# Altium footprint library PCB_CONNECTORS.PcbLib: 676 footprints (part 42 of 43)
Each footprint in its own frame and in the unit in brackets; x right, y up, seen from the top. Pads: shape width x height; smd on the part's side, far side on the other; paste and mask are expansions set on the pad; w line width, h text height; cw(c..) or ccw(c..) is an arc to the next point about the centre after c.
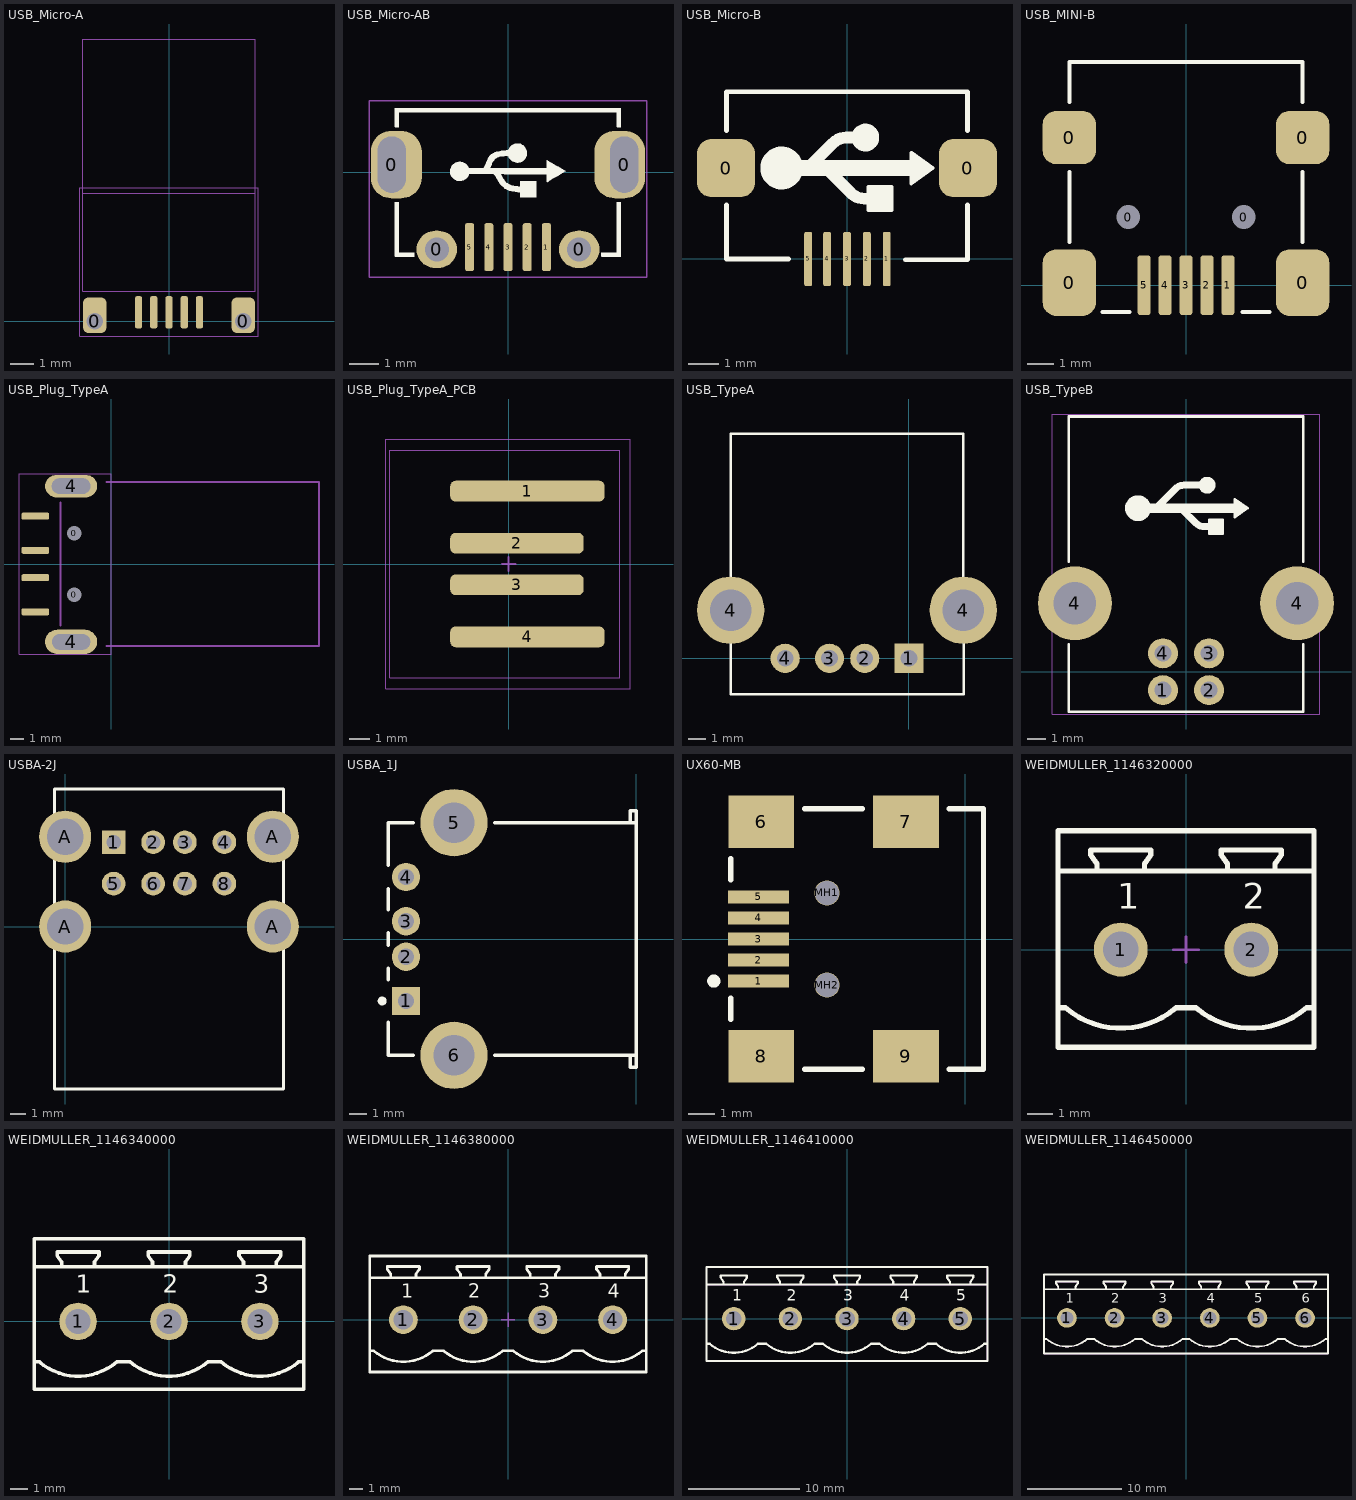
[diagram p41: the footprints below, top view; thin cyan lines are the x and y axes]

## USB_Micro-A [mil]
height 153.54
pads (7):
  rrect50% 40x60 hole 28 copper offset 0,10: 0(-125,0) 0(125,0)
  rrect50% 12x54 smd: 1(-51.18,15) 2(-25.59,15) 3(0,15) 4(25.59,15) 5(51.18,15)
Mechanical 13:
  lines w2: -145,215 145,215 ; -145,50 -145,475 145,475 145,50 -145,50
Mechanical 14:
  lines w2: -150,-25 -150,225 150,225 150,-25 -150,-25
  text ".Designator" at -90,80 h100
3D body "UJ2-MIBH-4-SMT.stp": height 108.27, standoff -24.02, extent -147.64,-15 147.64,449.57

## USB_Micro-AB [mil]
height 153.54
pads (9):
  rrect80% 68x90 hole 37 slot 75 at 90 deg copper offset 6,0 mask+0: 0(-155,10)
  oval 54x50 hole 32 mask+0: 0(-95,-103) 0(95,-103)
  rrect80% 68x90 hole 37 slot 75 at 90 deg copper offset -6,0 mask+0: 0(155,10)
  rrect50% 12x64 smd: 1(51.18,-100) 2(25.59,-100) 3(0,-100) 4(-25.59,-100) 5(-51.18,-100)
Top Overlay:
  drawing of 24 lines, arcs and shapes, not listed
Mechanical 14:
  lines w2: -185,-140 -185,95 185,95 185,-140 -185,-140
  text ".Designator" at -90,-45 h100
3D body "User Library-MicroUSB-B_Molex_105017-0001.STEP": height 108.07, standoff -21.85, extent -161.42,-109.33 161.42,104.45

## USB_Micro-B [mil]
height 153.54
pads (7):
  rrect50% 74.8x74.8 smd: 0(-155.51,116.84) 0(155.51,116.84)
  rrect50% 10x70 smd: 1(51.18,0) 2(25.59,0) 3(0,0) 4(-25.59,0) 5(-50,0)
Top Overlay:
  circle w20: c23.56,156.21 r7.87
  circle w35: c-84.07,117 r10
  region: 57.03,62.87 27.5,62.87 27.5,92.39 57.03,92.39
  region: 110.18,117 82.62,97.31 82.62,136.69
  lines w5: 27.5,62.87 57.03,62.87 57.03,92.39 27.5,92.39 27.5,62.87 ; 82.62,97.31 82.62,136.69 110.18,117 82.62,97.31
  lines w6: -155,69.8 -155,0 -75,0 ; -155,164.84 -155,215 155,215 155,164.84 ; 75,-1 155,-1 155,69.8
  lines w15: -52.85,114.46 -18.48,148.83 cw(c-0.65,131) -0.65,156.21 22.5,156.21 ; -24.7,114.54 4.83,85.01 ccw(c22.66,102.84) 22.66,77.63 42.5,77.63
  lines w20: -82.5,117 92.5,117
3D body "Micro USB.STP": height 106.7, standoff -9.04, extent -156.58,4.51 157.59,218.29

## USB_MINI-B [mil]
height 153.54
pads (11):
  rrect50% 80x100 smd: 0(-175.2,3.94) 0(175.19,3.94)
  rrect50% 80x80 smd: 0(-175.2,221.69) 0(175.19,221.69)
  round 23.62 hole 35.43 unplated: 0(-86.61,102.36) 0(86.61,102.36)
  rrect50% 20x90 smd: 1(62.99,0) 2(31.5,0) 3(0,0) 4(-31.5,0) 5(-62.99,0)
Top Overlay:
  lines w6: -175,65 -175,170 ; -175,275 -175,335 175,335 175,275 ; -125,-40 -85,-40 ; 85,-40 125,-40 ; 175,65 175,170
3D body "User Library-USB_mini_B.STEP": height 155.51, standoff -39.37, extent -210.63,-27.56 210.63,334.64

## USB_Plug_TypeA [mil]
height 177.17
pads (8):
  round 32 hole 42: 0(-106.3,-88.58) 0(-106.3,88.58)
  rrect50% 80x20 smd: 1(-218,137.8) 2(-218,39.37) 3(-218,-39.37) 4(-218,-137.8)
  oval 150x70 hole 45 slot 110 at 0 deg: 4(-115,-224)
  oval 150x65 hole 45 slot 111 at 0 deg: 4(-115,224)
Mechanical 13:
  lines w6: -145.67,-176.18 -145.67,176.18 ; -12.99,-236.22 598.43,-236.22 598.43,236.22 -12.99,236.22
Mechanical 14:
  lines w2: -265,-260 0,-260 0,260 -265,260 -265,-260
  text ".Designator" at -220,-25 h100
3D body "SW3dPS-USB-Male Port.STEP": height 70, standoff -117.5, extent -145.67,-236.37 576.08,236.37

## USB_Plug_TypeA_PCB [mm]
height 3.9
pads (4):
  rrect50% 7.41x1 smd: 1(0.897,3.5) 4(0.897,-3.5)
  rrect50% 6.41x1 smd: 2(0.397,1) 3(0.397,-1)
Mechanical 13:
  lines w0.051: -5.908,-6 -5.908,6 5.842,6 5.842,-6 -5.908,-6 ; -5.715,-5.461 5.334,-5.461 5.334,5.461 -5.715,5.461 -5.715,-5.461
  lines w0.1: -0.33,0 0.33,0 ; 0,-0.33 0,0.33

## USB_TypeA [mil]
pads (6):
  rect 65x65 hole 37: 1(0,0)
  round 65 hole 37: 2(-98.5,0) 3(-177,0) 4(-275.6,0)
  round 150 hole 93: 4(-397,107) 4(121,107)
Top Overlay:
  lines w6: 121,107 121,500 -397,500 -397,107 -397,-80 122,-80 122,107
3D body "User Library-USB-A-01.step": height 274.23, standoff -164.75, extent -449.02,-45 173.03,494.37

## USB_TypeB [mm]
height 11.1
pads (6):
  round 1.626 hole 0.914 mask+0.025: 1(-1.25,-0.995) 2(1.25,-0.995) 3(1.25,1.005) 4(-1.25,1.005)
  round 4 hole 2.3 mask+0: 4(-6.02,3.715) 4(6.02,3.715)
Top Overlay:
  circle w0.508: c1.145,10.115 r0.2
  circle w0.889: c-2.605,8.865 r0.254
  region: 1.995,7.49 1.245,7.49 1.245,8.24 1.995,8.24
  region: 3.345,8.865 2.645,8.365 2.645,9.365
  lines w0.127: 1.245,7.49 1.995,7.49 1.995,8.24 1.245,8.24 1.245,7.49 ; 2.645,8.365 2.645,9.365 3.345,8.865 2.645,8.365
  lines w0.152: -6.35,1.495 -6.35,-2.159 6.35,-2.159 6.35,1.495 ; -6.35,5.969 -6.35,13.843 6.35,13.843 6.35,5.969
  lines w0.381: -1.558,8.927 -0.558,9.927 cw(c-0.105,9.474) -0.105,10.115 1.145,10.115 ; -0.208,8.802 0.542,8.052 ccw(c0.995,8.505) 0.995,7.865 1.245,7.865
  lines w0.508: -2.105,8.865 2.645,8.865
Mechanical 14:
  lines w0.051: -7.239,-2.286 -7.239,13.97 7.239,13.97 7.239,-2.286 -7.239,-2.286
3D body "c-0292304-01-b-3d.stp": height 11.5, standoff -3.93, extent -7.194,-1.705 7.194,13.995

## USBA-2J [mm] "Dual port USB connector"
pads (12):
  rect 1.5x1.5 hole 0.92: 1(3.07,5.33)
  round 1.5 hole 0.92: 2(5.57,5.33) 3(7.57,5.33) 4(10.07,5.33) 5(3.07,2.71) 6(5.57,2.71) 7(7.57,2.71) 8(10.07,2.71)
  round 3.3 hole 2.3: A(0,0) A(0,5.68) A(13.14,0) A(13.14,5.68)
Top Overlay:
  lines w0.2: -0.68,-10.28 -0.68,8.7 13.82,8.7 13.82,-10.28 -0.68,-10.28
3D body "USBA-2J.STEP": height 16.15, standoff -3.99, extent -1.6,-10.29 14.659,6.89

## USBA_1J [mm] "Connector; USB1.1, Reverse Type, Thru-Hole; 4 Position; Right Angle"
height 6.95
pads (6):
  rect 1.6x1.6 hole 0.92: 1(-12.99,-3.5)
  round 1.6 hole 0.92: 2(-12.99,-1) 3(-12.99,1) 4(-12.99,3.5)
  round 3.8 hole 2.3: 5(-10.28,6.57) 6(-10.28,-6.57)
Top Overlay:
  circle w0.25: c-14.34,-3.5 r0.125
  lines w0.2: -14,-4.7 -14,-6.565 -12.58,-6.565 ; -14,-2.3 -14,-1.66 ; -14,-0.34 -14,0.34 ; -14,1.66 -14,2.84 ; -14,4.16 -14,6.565 -12.58,6.565 ; -7.98,-6.565 0,-6.565 ; -7.98,6.565 0,6.565 ; -0.32,-6.565 -0.32,-7.25 0,-7.25 0,-6.565 ; -0.32,6.565 -0.32,7.25 0,7.25 0,6.565 ; 0,-6.565 0,6.565
3D body "USB-1A.STEP": height 7.66, standoff -3.62, extent -14,-8.117 0,8.117

## UX60-MB [mm] "Connector; USB2.0, Type B, SM; 5 Position; Right Angle"
height 3.9
pads (11):
  rect 2.3x0.5 smd: 1(-7.85,-1.6) 2(-7.85,-0.8) 3(-7.85,0) 4(-7.85,0.8) 5(-7.85,1.6)
  rect 2.5x2 smd: 6(-7.75,4.45) 7(-2.25,4.45) 8(-7.75,-4.45) 9(-2.25,-4.45)
  round 0.95 hole 0.9 unplated: MH1(-5.25,1.75) MH2(-5.25,-1.75)
Top Overlay:
  circle w0.25: c-9.55,-1.6 r0.125
  lines w0.2: -8.9,-3.05 -8.9,-2.25 ; -8.9,2.25 -8.9,3.05 ; -6.1,-4.95 -3.9,-4.95 ; -6.1,4.95 -3.9,4.95 ; -0.6,-4.95 0.7,-4.95 0.7,4.95 -0.6,4.95
3D body "mini-usb2.stp": height 3.93, standoff -0.05, extent -8.825,-5.1 0.425,4.8

## WEIDMULLER_1146320000 [mm] "24A 400 V, Pitch 5.08mm, 2 Positions PCB Male Header, Type SL 5.08HC Serie"
height 12
pads (2):
  round 2.1 hole 1.4: 1(-2.54,0) 2(2.54,0)
Top Overlay:
  lines w0.2: -4.98,-2.26 -4.694,-2.26 ccw(c-2.54,0.24) -0.386,-2.26 0.386,-2.26 ccw(c2.54,0.24) 4.694,-2.26 4.98,-2.26 ; -4.98,3.06 4.98,3.06 ; -3.46,3.06 -3.46,3.323 -3.71,3.68 -3.71,3.88 -1.37,3.88 -1.37,3.68 -1.62,3.323 -1.62,3.06 ; 1.62,3.06 1.62,3.323 1.37,3.68 1.37,3.88 3.71,3.88 3.71,3.68 3.46,3.323 3.46,3.06 ; -4.98,-3.8 -4.98,4.63 4.98,4.63 4.98,-3.8 -4.98,-3.8
  text "1" at -2.675,1.6 h1
  text "2" at 2.2,1.6 h1
Mechanical 8:
  lines w0.1: -3.04,0 -2.54,0 ; -2.54,-0.5 -2.54,0 ; -2.54,0.5 -2.54,0 ; -2.04,0 -2.54,0 ; -0.5,0 0,0 ; 0,-0.5 0,0 ; 0,0.5 0,0 ; 0.5,0 0,0 ; 2.04,0 2.54,0 ; 2.54,-0.5 2.54,0 ; 2.54,0.5 2.54,0 ; 3.04,0 2.54,0
Mechanical 14:
  lines w0.1: -4.98,-2.26 -4.694,-2.26 ccw(c-2.54,0.24) -0.386,-2.26 0.386,-2.26 ccw(c2.54,0.24) 4.694,-2.26 4.98,-2.26 ; -4.98,3.06 4.98,3.06 ; -3.46,3.06 -3.46,3.323 -3.71,3.68 -3.71,3.88 -1.37,3.88 -1.37,3.68 -1.62,3.323 -1.62,3.06 ; 1.62,3.06 1.62,3.323 1.37,3.68 1.37,3.88 3.71,3.88 3.71,3.68 3.46,3.323 3.46,3.06 ; -4.98,-3.8 -4.98,4.63 4.98,4.63 4.98,-3.8 -4.98,-3.8 ; -3.04,-0.332 -3.04,0.332 -2.872,0.5 -2.208,0.5 -2.04,0.332 -2.04,-0.332 -2.2,-0.494 -2.872,-0.5 -3.04,-0.332 ; 2.04,-0.332 2.04,0.332 2.208,0.5 2.872,0.5 3.04,0.332 3.04,-0.332 2.88,-0.494 2.208,-0.5 2.04,-0.332
  text "2" at 2.2,1.6 h1
  text "1" at -2.675,1.6 h1
3D body "WEIDMULLER_1146320000.stp": height 12, standoff -3.2, extent -4.98,-3.8 4.98,4.63

## WEIDMULLER_1146340000 [mm] "24A 400 V, Pitch 5.08mm, 3 Positions PCB Male Header, Type SL 5.08HC Serie"
height 12
pads (3):
  round 2.1 hole 1.4: 1(-5.08,0) 2(0,0) 3(5.08,0)
Top Overlay:
  lines w0.2: -7.52,-2.26 -7.234,-2.26 ccw(c-5.08,0.24) -2.926,-2.26 -2.154,-2.26 ccw(c0,0.24) 2.154,-2.26 2.926,-2.26 ccw(c5.08,0.24) 7.234,-2.26 7.52,-2.26 ; -7.52,3.06 7.52,3.06 ; -6,3.06 -6,3.323 -6.25,3.68 -6.25,3.88 -3.91,3.88 -3.91,3.68 -4.16,3.323 -4.16,3.06 ; -0.92,3.06 -0.92,3.323 -1.17,3.68 -1.17,3.88 1.17,3.88 1.17,3.68 0.92,3.323 0.92,3.06 ; 4.16,3.06 4.16,3.323 3.91,3.68 3.91,3.88 6.25,3.88 6.25,3.68 6,3.323 6,3.06 ; -7.52,-3.8 -7.52,4.63 7.52,4.63 7.52,-3.8 -7.52,-3.8
  text "3" at 4.74,1.6 h1
  text "1" at -5.215,1.6 h1
  text "2" at -0.34,1.6 h1
Mechanical 8:
  lines w0.1: -5.58,0 -5.08,0 ; -5.08,-0.5 -5.08,0 ; -5.08,0.5 -5.08,0 ; -4.58,0 -5.08,0 ; 4.58,0 5.08,0 ; 5.08,-0.5 5.08,0 ; 5.08,0.5 5.08,0 ; 5.58,0 5.08,0 ; 0,0 0,0.5 0,0 ; 0,0 0.5,0 0,0 ; 0,0 0,-0.5 0,0 ; 0,0 -0.5,0 0,0
Mechanical 14:
  lines w0.1: -7.52,-2.26 -7.234,-2.26 ccw(c-5.08,0.24) -2.926,-2.26 -2.154,-2.26 ccw(c0,0.24) 2.154,-2.26 2.926,-2.26 ccw(c5.08,0.24) 7.234,-2.26 7.52,-2.26 ; -7.52,3.06 7.52,3.06 ; -6,3.06 -6,3.323 -6.25,3.68 -6.25,3.88 -3.91,3.88 -3.91,3.68 -4.16,3.323 -4.16,3.06 ; -0.92,3.06 -0.92,3.323 -1.17,3.68 -1.17,3.88 1.17,3.88 1.17,3.68 0.92,3.323 0.92,3.06 ; 4.16,3.06 4.16,3.323 3.91,3.68 3.91,3.88 6.25,3.88 6.25,3.68 6,3.323 6,3.06 ; -7.52,-3.8 -7.52,4.63 7.52,4.63 7.52,-3.8 -7.52,-3.8 ; -5.58,-0.332 -5.58,0.332 -5.412,0.5 -4.748,0.5 -4.58,0.332 -4.58,-0.332 -4.74,-0.494 -5.412,-0.5 -5.58,-0.332 ; -0.5,-0.332 -0.5,0.332 -0.332,0.5 0.332,0.5 0.5,0.332 0.5,-0.332 0.34,-0.494 -0.332,-0.5 -0.5,-0.332 ; 4.58,-0.332 4.58,0.332 4.748,0.5 5.412,0.5 5.58,0.332 5.58,-0.332 5.42,-0.494 4.748,-0.5 4.58,-0.332
  text "3" at 4.74,1.6 h1
  text "2" at -0.34,1.6 h1
  text "1" at -5.215,1.6 h1
3D body "WEIDMULLER_1146340000.stp": height 12, standoff -3.2, extent -7.52,-3.8 7.52,4.63

## WEIDMULLER_1146380000 [mm] "24A 400 V, Pitch 5.08mm, 4 Positions PCB Male Header, Type SL 5.08HC Serie"
height 12
pads (4):
  round 2.1 hole 1.4: 1(-7.62,0) 2(-2.54,0) 3(2.54,0) 4(7.62,0)
Top Overlay:
  lines w0.2: -10.06,-2.26 -9.774,-2.26 ccw(c-7.62,0.24) -5.466,-2.26 -4.694,-2.26 ccw(c-2.54,0.24) -0.386,-2.26 0.386,-2.26 ccw(c2.54,0.24) 4.694,-2.26 5.466,-2.26 ccw(c7.62,0.24) 9.774,-2.26 10.06,-2.26 ; -10.06,3.06 10.06,3.06 ; -8.54,3.06 -8.54,3.323 -8.79,3.68 -8.79,3.88 -6.45,3.88 -6.45,3.68 -6.7,3.323 -6.7,3.06 ; -3.46,3.06 -3.46,3.323 -3.71,3.68 -3.71,3.88 -1.37,3.88 -1.37,3.68 -1.62,3.323 -1.62,3.06 ; 1.62,3.06 1.62,3.323 1.37,3.68 1.37,3.88 3.71,3.88 3.71,3.68 3.46,3.323 3.46,3.06 ; 6.7,3.06 6.7,3.323 6.45,3.68 6.45,3.88 8.79,3.88 8.79,3.68 8.54,3.323 8.54,3.06 ; -10.06,-3.8 -10.06,4.63 10.06,4.63 10.06,-3.8 -10.06,-3.8
  text "4" at 7.28,1.6 h1
  text "3" at 2.2,1.6 h1
  text "1" at -7.755,1.6 h1
  text "2" at -2.88,1.6 h1
Mechanical 8:
  lines w0.1: -8.12,0 -7.62,0 ; -7.62,-0.5 -7.62,0 ; -7.62,0.5 -7.62,0 ; -7.12,0 -7.62,0 ; 7.12,0 7.62,0 ; 7.62,-0.5 7.62,0 ; 7.62,0.5 7.62,0 ; 8.12,0 7.62,0 ; -2.54,0 -2.54,0.5 -2.54,0 ; -2.54,0 -2.04,0 -2.54,0 ; -2.54,0 -2.54,-0.5 -2.54,0 ; -2.54,0 -3.04,0 -2.54,0 ; 0,0 0,0.5 0,0 ; 0,0 0.5,0 0,0 ; 0,0 0,-0.5 0,0 ; 0,0 -0.5,0 0,0 ; 2.54,0 2.54,0.5 2.54,0 ; 2.54,0 3.04,0 2.54,0 ; 2.54,0 2.54,-0.5 2.54,0 ; 2.54,0 2.04,0 2.54,0
Mechanical 14:
  lines w0.1: -10.06,-2.26 -9.774,-2.26 ccw(c-7.62,0.24) -5.466,-2.26 -4.694,-2.26 ccw(c-2.54,0.24) -0.386,-2.26 0.386,-2.26 ccw(c2.54,0.24) 4.694,-2.26 5.466,-2.26 ccw(c7.62,0.24) 9.774,-2.26 10.06,-2.26 ; -10.06,3.06 10.06,3.06 ; -8.54,3.06 -8.54,3.323 -8.79,3.68 -8.79,3.88 -6.45,3.88 -6.45,3.68 -6.7,3.323 -6.7,3.06 ; -3.46,3.06 -3.46,3.323 -3.71,3.68 -3.71,3.88 -1.37,3.88 -1.37,3.68 -1.62,3.323 -1.62,3.06 ; 1.62,3.06 1.62,3.323 1.37,3.68 1.37,3.88 3.71,3.88 3.71,3.68 3.46,3.323 3.46,3.06 ; 6.7,3.06 6.7,3.323 6.45,3.68 6.45,3.88 8.79,3.88 8.79,3.68 8.54,3.323 8.54,3.06 ; -10.06,-3.8 -10.06,4.63 10.06,4.63 10.06,-3.8 -10.06,-3.8 ; -8.12,-0.332 -8.12,0.332 -7.952,0.5 -7.288,0.5 -7.12,0.332 -7.12,-0.332 -7.28,-0.494 -7.952,-0.5 -8.12,-0.332 ; -3.04,-0.332 -3.04,0.332 -2.872,0.5 -2.208,0.5 -2.04,0.332 -2.04,-0.332 -2.2,-0.494 -2.872,-0.5 -3.04,-0.332 ; 2.04,-0.332 2.04,0.332 2.208,0.5 2.872,0.5 3.04,0.332 3.04,-0.332 2.88,-0.494 2.208,-0.5 2.04,-0.332 ; 7.12,-0.332 7.12,0.332 7.288,0.5 7.952,0.5 8.12,0.332 8.12,-0.332 7.96,-0.494 7.288,-0.5 7.12,-0.332
  text "4" at 7.28,1.6 h1
  text "3" at 2.2,1.6 h1
  text "2" at -2.88,1.6 h1
  text "1" at -7.755,1.6 h1
3D body "WEIDMULLER_1146380000.stp": height 12, standoff -3.2, extent -10.06,-3.8 10.06,4.63

## WEIDMULLER_1146410000 [mm] "24A 400 V, Pitch 5.08mm, 5 Positions PCB Male Header, Type SL 5.08HC Serie"
height 12
pads (5):
  round 2.1 hole 1.4: 1(-10.16,0) 2(-5.08,0) 3(0,0) 4(5.08,0) 5(10.16,0)
Top Overlay:
  lines w0.2: -12.6,-2.26 -12.314,-2.26 ccw(c-10.16,0.24) -8.006,-2.26 -7.234,-2.26 ccw(c-5.08,0.24) -2.926,-2.26 -2.154,-2.26 ccw(c0,0.24) 2.154,-2.26 2.926,-2.26 ccw(c5.08,0.24) 7.234,-2.26 8.006,-2.26 ccw(c10.16,0.24) 12.314,-2.26 12.6,-2.26 ; -12.6,3.06 12.6,3.06 ; -11.08,3.06 -11.08,3.323 -11.33,3.68 -11.33,3.88 -8.99,3.88 -8.99,3.68 -9.24,3.323 -9.24,3.06 ; -6,3.06 -6,3.323 -6.25,3.68 -6.25,3.88 -3.91,3.88 -3.91,3.68 -4.16,3.323 -4.16,3.06 ; -0.92,3.06 -0.92,3.323 -1.17,3.68 -1.17,3.88 1.17,3.88 1.17,3.68 0.92,3.323 0.92,3.06 ; 4.16,3.06 4.16,3.323 3.91,3.68 3.91,3.88 6.25,3.88 6.25,3.68 6,3.323 6,3.06 ; 9.24,3.06 9.24,3.323 8.99,3.68 8.99,3.88 11.33,3.88 11.33,3.68 11.08,3.323 11.08,3.06 ; -12.6,-3.8 12.6,-3.8 12.6,4.63 -12.6,4.63 -12.6,-3.8
  text "3" at -0.34,1.6 h1
  text "1" at -10.295,1.6 h1
  text "2" at -5.42,1.6 h1
  text "4" at 4.74,1.6 h1
  text "5" at 9.82,1.6 h1
Mechanical 8:
  lines w0.1: -10.66,0 -10.16,0 ; -10.16,-0.5 -10.16,0 ; -10.16,0.5 -10.16,0 ; -9.66,0 -10.16,0 ; 9.66,0 10.16,0 ; 10.16,-0.5 10.16,0 ; 10.16,0.5 10.16,0 ; 10.66,0 10.16,0 ; -5.08,0 -5.58,0 -5.08,0 ; -5.08,0 -5.08,-0.5 -5.08,0 ; -5.08,0 -4.58,0 -5.08,0 ; -5.08,0 -5.08,0.5 -5.08,0 ; -0.5,0 0,0 ; -0.5,0 0,0 ; -0.5,0 0,0 ; -0.5,0 0,0 ; 0,-0.5 0,0 ; 0,-0.5 0,0 ; 0,-0.5 0,0 ; 0,-0.5 0,0 ; 0,0 0.5,0 ; 0,0 0,0.5 ; 0,0 0.5,0 ; 0,0 0,0.5 ; 0,0 0.5,0 ; 0,0 0,0.5 ; 0,0 0.5,0 ; 0,0 0,0.5 ; 5.08,0 4.58,0 5.08,0 ; 5.08,0 5.08,-0.5 5.08,0 ; 5.08,0 5.58,0 5.08,0 ; 5.08,0 5.08,0.5 5.08,0
Mechanical 14:
  lines w0.1: -12.6,-2.26 -12.314,-2.26 ccw(c-10.16,0.24) -8.006,-2.26 -7.234,-2.26 ccw(c-5.08,0.24) -2.926,-2.26 -2.154,-2.26 ccw(c0,0.24) 2.154,-2.26 2.926,-2.26 ccw(c5.08,0.24) 7.234,-2.26 8.006,-2.26 ccw(c10.16,0.24) 12.314,-2.26 12.6,-2.26 ; -12.6,3.06 12.6,3.06 ; -11.08,3.06 -11.08,3.323 -11.33,3.68 -11.33,3.88 -8.99,3.88 -8.99,3.68 -9.24,3.323 -9.24,3.06 ; -6,3.06 -6,3.323 -6.25,3.68 -6.25,3.88 -3.91,3.88 -3.91,3.68 -4.16,3.323 -4.16,3.06 ; -0.92,3.06 -0.92,3.323 -1.17,3.68 -1.17,3.88 1.17,3.88 1.17,3.68 0.92,3.323 0.92,3.06 ; 4.16,3.06 4.16,3.323 3.91,3.68 3.91,3.88 6.25,3.88 6.25,3.68 6,3.323 6,3.06 ; 9.24,3.06 9.24,3.323 8.99,3.68 8.99,3.88 11.33,3.88 11.33,3.68 11.08,3.323 11.08,3.06 ; -12.6,-3.8 12.6,-3.8 12.6,4.63 -12.6,4.63 -12.6,-3.8 ; -10.66,-0.332 -10.492,-0.5 -9.82,-0.494 -9.66,-0.332 -9.66,0.332 -9.828,0.5 -10.492,0.5 -10.66,0.332 -10.66,-0.332 ; -5.58,-0.332 -5.412,-0.5 -4.74,-0.494 -4.58,-0.332 -4.58,0.332 -4.748,0.5 -5.412,0.5 -5.58,0.332 -5.58,-0.332 ; -0.5,-0.332 -0.332,-0.5 0.34,-0.494 0.5,-0.332 0.5,0.332 0.332,0.5 -0.332,0.5 -0.5,0.332 -0.5,-0.332 ; 4.58,-0.332 4.748,-0.5 5.42,-0.494 5.58,-0.332 5.58,0.332 5.412,0.5 4.748,0.5 4.58,0.332 4.58,-0.332 ; 9.66,-0.332 9.828,-0.5 10.5,-0.494 10.66,-0.332 10.66,0.332 10.492,0.5 9.828,0.5 9.66,0.332 9.66,-0.332
  text "3" at -0.34,1.6 h1
  text "2" at -5.42,1.6 h1
  text "1" at -10.295,1.6 h1
  text "4" at 4.74,1.6 h1
  text "5" at 9.82,1.6 h1
3D body "WEIDMULLER_1146410000.stp": height 12, standoff -3.2, extent -12.6,-3.8 12.6,4.63

## WEIDMULLER_1146450000 [mm] "24A 400 V, Pitch 5.08mm, 6 Positions PCB Male Header, Type SL 5.08HC Serie"
height 12
pads (6):
  round 2.1 hole 1.4: 1(-12.7,0) 2(-7.62,0) 3(-2.54,0) 4(2.54,0) 5(7.62,0) 6(12.7,0)
Top Overlay:
  lines w0.2: -15.14,-2.26 -14.854,-2.26 ccw(c-12.7,0.24) -10.546,-2.26 -9.774,-2.26 ccw(c-7.62,0.24) -5.466,-2.26 -4.694,-2.26 ccw(c-2.54,0.24) -0.386,-2.26 0.386,-2.26 ccw(c2.54,0.24) 4.694,-2.26 5.466,-2.26 ccw(c7.62,0.24) 9.774,-2.26 10.546,-2.26 ccw(c12.7,0.24) 14.854,-2.26 15.14,-2.26 ; -15.14,3.06 15.14,3.06 ; -13.62,3.06 -13.62,3.323 -13.87,3.68 -13.87,3.88 -11.53,3.88 -11.53,3.68 -11.78,3.323 -11.78,3.06 ; -8.54,3.06 -8.54,3.323 -8.79,3.68 -8.79,3.88 -6.45,3.88 -6.45,3.68 -6.7,3.323 -6.7,3.06 ; -3.46,3.06 -3.46,3.323 -3.71,3.68 -3.71,3.88 -1.37,3.88 -1.37,3.68 -1.62,3.323 -1.62,3.06 ; 1.62,3.06 1.62,3.323 1.37,3.68 1.37,3.88 3.71,3.88 3.71,3.68 3.46,3.323 3.46,3.06 ; 6.7,3.06 6.7,3.323 6.45,3.68 6.45,3.88 8.79,3.88 8.79,3.68 8.54,3.323 8.54,3.06 ; 11.78,3.06 11.78,3.323 11.53,3.68 11.53,3.88 13.87,3.88 13.87,3.68 13.62,3.323 13.62,3.06 ; -15.14,-3.8 15.14,-3.8 15.14,4.63 -15.14,4.63 -15.14,-3.8
  text "3" at -2.88,1.6 h1
  text "1" at -12.835,1.6 h1
  text "2" at -7.96,1.6 h1
  text "4" at 2.2,1.6 h1
  text "5" at 7.28,1.6 h1
  text "6" at 12.36,1.6 h1
Mechanical 8:
  lines w0.1: -13.2,0 -12.7,0 ; -12.7,-0.5 -12.7,0 ; -12.7,0.5 -12.7,0 ; -12.2,0 -12.7,0 ; 7.12,0 7.62,0 ; 7.62,-0.5 7.62,0 ; 7.62,0.5 7.62,0 ; 8.12,0 7.62,0 ; 12.2,0 12.7,0 ; 12.7,-0.5 12.7,0 ; 12.7,0.5 12.7,0 ; 13.2,0 12.7,0 ; -7.62,0 -8.12,0 -7.62,0 ; -7.62,0 -7.62,-0.5 -7.62,0 ; -7.62,0 -7.12,0 -7.62,0 ; -7.62,0 -7.62,0.5 -7.62,0 ; -3.04,0 -2.54,0 ; -3.04,0 -2.54,0 ; -3.04,0 -2.54,0 ; -3.04,0 -2.54,0 ; -3.04,0 -2.54,0 ; -3.04,0 -2.54,0 ; -3.04,0 -2.54,0 ; -3.04,0 -2.54,0 ; -2.54,-0.5 -2.54,0 ; -2.54,-0.5 -2.54,0 ; -2.54,-0.5 -2.54,0 ; -2.54,-0.5 -2.54,0 ; -2.54,-0.5 -2.54,0 ; -2.54,-0.5 -2.54,0 ; -2.54,-0.5 -2.54,0 ; -2.54,-0.5 -2.54,0 ; -2.54,0 -2.04,0 ; -2.54,0 -2.54,0.5 ; -2.54,0 -2.04,0 ; -2.54,0 -2.54,0.5 ; -2.54,0 -2.04,0 ; -2.54,0 -2.54,0.5 ; -2.54,0 -2.04,0 ; -2.54,0 -2.54,0.5 ; -2.54,0 -2.04,0 ; -2.54,0 -2.54,0.5 ; -2.54,0 -2.04,0 ; -2.54,0 -2.54,0.5 ; -2.54,0 -2.04,0 ; -2.54,0 -2.54,0.5 ; -2.54,0 -2.04,0 ; -2.54,0 -2.54,0.5 ; 2.54,0 2.04,0 2.54,0 ; 2.54,0 2.54,-0.5 2.54,0 ; 2.54,0 3.04,0 2.54,0 ; 2.54,0 2.54,0.5 2.54,0
Mechanical 14:
  lines w0.1: -15.14,-2.26 -14.854,-2.26 ccw(c-12.7,0.24) -10.546,-2.26 -9.774,-2.26 ccw(c-7.62,0.24) -5.466,-2.26 -4.694,-2.26 ccw(c-2.54,0.24) -0.386,-2.26 0.386,-2.26 ccw(c2.54,0.24) 4.694,-2.26 5.466,-2.26 ccw(c7.62,0.24) 9.774,-2.26 10.546,-2.26 ccw(c12.7,0.24) 14.854,-2.26 15.14,-2.26 ; -15.14,3.06 15.14,3.06 ; -13.62,3.06 -13.62,3.323 -13.87,3.68 -13.87,3.88 -11.53,3.88 -11.53,3.68 -11.78,3.323 -11.78,3.06 ; -8.54,3.06 -8.54,3.323 -8.79,3.68 -8.79,3.88 -6.45,3.88 -6.45,3.68 -6.7,3.323 -6.7,3.06 ; -3.46,3.06 -3.46,3.323 -3.71,3.68 -3.71,3.88 -1.37,3.88 -1.37,3.68 -1.62,3.323 -1.62,3.06 ; 1.62,3.06 1.62,3.323 1.37,3.68 1.37,3.88 3.71,3.88 3.71,3.68 3.46,3.323 3.46,3.06 ; 6.7,3.06 6.7,3.323 6.45,3.68 6.45,3.88 8.79,3.88 8.79,3.68 8.54,3.323 8.54,3.06 ; 11.78,3.06 11.78,3.323 11.53,3.68 11.53,3.88 13.87,3.88 13.87,3.68 13.62,3.323 13.62,3.06 ; -15.14,-3.8 15.14,-3.8 15.14,4.63 -15.14,4.63 -15.14,-3.8 ; -13.2,-0.332 -13.032,-0.5 -12.36,-0.494 -12.2,-0.332 -12.2,0.332 -12.368,0.5 -13.032,0.5 -13.2,0.332 -13.2,-0.332 ; -8.12,-0.332 -7.952,-0.5 -7.28,-0.494 -7.12,-0.332 -7.12,0.332 -7.288,0.5 -7.952,0.5 -8.12,0.332 -8.12,-0.332 ; -3.04,-0.332 -2.872,-0.5 -2.2,-0.494 -2.04,-0.332 -2.04,0.332 -2.208,0.5 -2.872,0.5 -3.04,0.332 -3.04,-0.332 ; 2.04,-0.332 2.208,-0.5 2.88,-0.494 3.04,-0.332 3.04,0.332 2.872,0.5 2.208,0.5 2.04,0.332 2.04,-0.332 ; 7.12,-0.332 7.288,-0.5 7.96,-0.494 8.12,-0.332 8.12,0.332 7.952,0.5 7.288,0.5 7.12,0.332 7.12,-0.332 ; 12.2,-0.332 12.368,-0.5 13.04,-0.494 13.2,-0.332 13.2,0.332 13.032,0.5 12.368,0.5 12.2,0.332 12.2,-0.332
  text "3" at -2.88,1.6 h1
  text "2" at -7.96,1.6 h1
  text "1" at -12.835,1.6 h1
  text "4" at 2.2,1.6 h1
  text "5" at 7.28,1.6 h1
  text "6" at 12.36,1.6 h1
3D body "WEIDMULLER_1146450000.stp": height 12, standoff -3.2, extent -15.14,-3.8 15.14,4.63